# Altium footprint library MainLibrary.PcbLib: 85 footprints (part 3 of 6)
Each footprint in its own frame and in the unit in brackets; x right, y up, seen from the top. Pads: shape width x height; smd on the part's side, far side on the other; paste and mask are expansions set on the pad; w line width, h text height; cw(c..) or ccw(c..) is an arc to the next point about the centre after c.
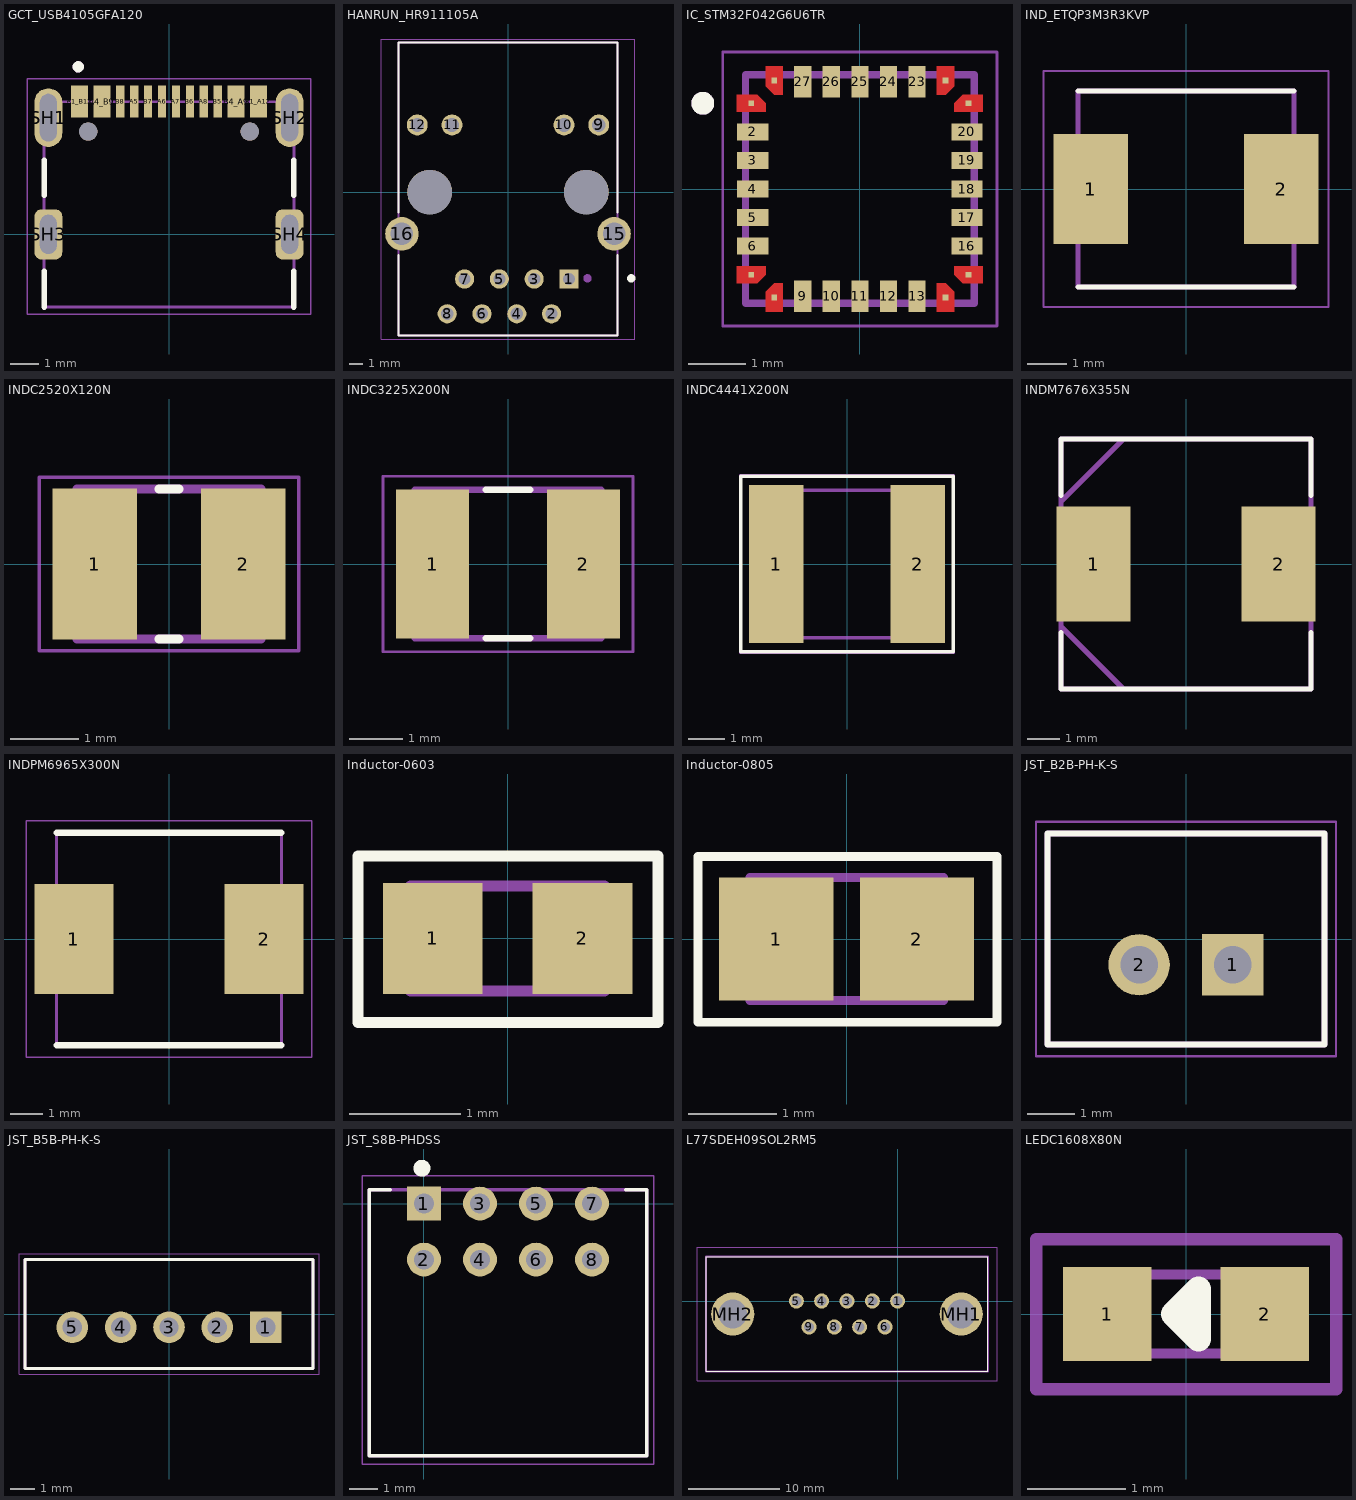
[diagram p2: the footprints below, top view; thin cyan lines are the x and y axes]

## GCT_USB4105GFA120 [mm]
height 3.31
pads (18):
  rect 0.6x1.15 smd: A1_B12(-3.2,4.755) A4_B9(-2.4,4.755) B1_A12(3.2,4.755) B4_A9(2.4,4.755)
  rect 0.3x1.15 smd: A5(-1.25,4.755) A6(-0.25,4.755) A7(0.25,4.755) A8(1.25,4.755) B5(1.75,4.755) B6(0.75,4.755) B7(-0.75,4.755) B8(-1.75,4.755)
  oval 1x2.1 hole 0.6 slot 1.7 at 90 deg: SH1(-4.32,4.18) SH2(4.32,4.18)
  rrect50% 1x1.8 hole 0.6 slot 1.4 at 90 deg: SH3(-4.32,0) SH4(4.32,0)
  round 0.65 hole 0.65 unplated: ""(-2.89,3.68) ""(2.89,3.68)
Top Overlay:
  circle w0.2: c-3.25,6 r0.1
  lines w0.2: -4.47,-2.6 -4.47,-1.32 ; -4.47,1.4 -4.47,2.65 ; 4.47,-2.6 4.47,-1.32 ; 4.47,1.4 4.47,2.65
Mechanical 13:
  circle w0.2: c-3.25,6 r0.1
  lines w0.1: -4.47,-2.6 4.47,-2.6 4.47,4.75 -4.47,4.75 -4.47,-2.6
Mechanical 15:
  lines w0.05: -5.07,-2.85 -5.07,5.58 5.07,5.58 5.07,-2.85 -5.07,-2.85
3D body "step_temp.STEP": height 3.31, standoff -1.2, extent -4.47,-2.6 4.47,5.11

## HANRUN_HR911105A [mm]
pads (16):
  rect 1.398x1.398 / inner round 1.398 / far side rect 1.398x1.398 hole 0.89: 1(4.45,-6.35)
  round 1.398 hole 0.89: 2(3.18,-8.89) 3(1.91,-6.35) 4(0.64,-8.89) 5(-0.63,-6.35) 6(-1.9,-8.89) 7(-3.17,-6.35) 8(-4.44,-8.89)
  round 1.53 hole 1.02: 9(6.625,4.9) 10(4.085,4.9) 11(-4.085,4.9) 12(-6.625,4.9)
  round 2.445 hole 1.63: 15(7.745,-3.05) 16(-7.745,-3.05)
  round 3.25 hole 3.25 unplated: ""(-5.715,0) ""(5.715,0)
Top Overlay:
  circle w0.3: c9,-6.3 r0.15
  lines w0.127: -8,-4.6 -8,-10.48 8,-10.48 8,-4.6 ; -8,-1.5 -8,10.92 8,10.92 8,-1.5
Mechanical 13:
  circle w0.3: c5.8,-6.3 r0.15
  lines w0.127: -8,-10.48 -8,10.92 8,10.92 8,-10.48 -8,-10.48
Mechanical 15:
  lines w0.05: -9.25,-10.73 -9.25,11.17 9.25,11.17 9.25,-10.73 -9.25,-10.73
3D body "step_temp.STEP": height 13.5, standoff -3.05, extent -8.02,-10.38 8.02,10.92

## IC_STM32F042G6U6TR [mm]
pads (28):
  rect 0.1x0.1 smd paste-1 mask+0: 1(-1.9,1.5) 7(-1.9,-1.5) 8(-1.5,-1.9) 14(1.5,-1.9) 15(1.9,-1.5) 21(1.9,1.5) 22(1.5,1.9) 28(-1.5,1.9)
  rect 0.55x0.3 smd: 2(-1.875,1) 3(-1.875,0.5) 4(-1.875,0) 5(-1.875,-0.5) 6(-1.875,-1) 16(1.875,-1) 17(1.875,-0.5) 18(1.875,0) 19(1.875,0.5) 20(1.875,1)
  rect 0.3x0.55 smd: 9(-1,-1.875) 10(-0.5,-1.875) 11(0,-1.875) 12(0.5,-1.875) 13(1,-1.875) 23(1,1.875) 24(0.5,1.875) 25(0,1.875) 26(-0.5,1.875) 27(-1,1.875)
Top Layer:
  region: -1.65,1.5 -1.65,1.35 -2.15,1.35 -2.15,1.65 -1.8,1.65
  region: -1.65,-1.5 -1.8,-1.65 -2.15,-1.65 -2.15,-1.35 -1.65,-1.35
  region: -1.35,-2.15 -1.65,-2.15 -1.65,-1.8 -1.5,-1.65 -1.35,-1.65
  region: 1.65,-1.8 1.65,-2.15 1.35,-2.15 1.35,-1.65 1.5,-1.65
  region: 2.15,-1.65 1.8,-1.65 1.65,-1.5 1.65,-1.35 2.15,-1.35
  region: 2.15,1.35 1.65,1.35 1.65,1.5 1.8,1.65 2.15,1.65
  region: 1.65,1.8 1.5,1.65 1.35,1.65 1.35,2.15 1.65,2.15
  region: -1.35,1.65 -1.5,1.65 -1.65,1.8 -1.65,2.15 -1.35,2.15
Top Overlay:
  circle w0.2: c-2.75,1.5 r0.1
Top Paste:
  region: -1.65,1.5 -1.65,1.35 -2.15,1.35 -2.15,1.65 -1.8,1.65
  region: -1.65,-1.5 -1.8,-1.65 -2.15,-1.65 -2.15,-1.35 -1.65,-1.35
  region: -1.35,-2.15 -1.65,-2.15 -1.65,-1.8 -1.5,-1.65 -1.35,-1.65
  region: 1.65,-1.8 1.65,-2.15 1.35,-2.15 1.35,-1.65 1.5,-1.65
  region: 2.15,-1.65 1.8,-1.65 1.65,-1.5 1.65,-1.35 2.15,-1.35
  region: 2.15,1.35 1.65,1.35 1.65,1.5 1.8,1.65 2.15,1.65
  region: 1.65,1.8 1.5,1.65 1.35,1.65 1.35,2.15 1.65,2.15
  region: -1.35,1.65 -1.5,1.65 -1.65,1.8 -1.65,2.15 -1.35,2.15
Top Solder:
  region: -1.55,1.5 -1.55,1.25 -2.25,1.25 -2.25,1.75 -1.8,1.75
  region: -1.55,-1.5 -1.8,-1.75 -2.25,-1.75 -2.25,-1.25 -1.55,-1.25
  region: -1.25,-2.25 -1.75,-2.25 -1.75,-1.8 -1.5,-1.55 -1.25,-1.55
  region: 1.75,-1.8 1.75,-2.25 1.25,-2.25 1.25,-1.55 1.5,-1.55
  region: 2.25,-1.75 1.8,-1.75 1.55,-1.5 1.55,-1.25 2.25,-1.25
  region: 2.25,1.25 1.55,1.25 1.55,1.5 1.8,1.75 2.25,1.75
  region: 1.75,1.8 1.5,1.55 1.25,1.55 1.25,2.25 1.75,2.25
  region: -1.25,1.55 -1.5,1.55 -1.75,1.8 -1.75,2.25 -1.25,2.25
Mechanical 13:
  circle w0.2: c-2.75,1.5 r0.1
  lines w0.127: -2,-2 2,-2 2,2 -2,2 -2,-2
Mechanical 15:
  lines w0.05: -2.4,-2.4 2.4,-2.4 2.4,2.4 -2.4,2.4 -2.4,-2.4
3D body "STM32F042G6U6TR.STEP": height 0.6, standoff 0, extent -2,-2 2,2

## IND_ETQP3M3R3KVP [mm]
pads (2):
  rect 1.905x2.79 smd: 1(-2.425,0) 2(2.425,0)
Top Overlay:
  lines w0.127: -2.75,-2.5 2.75,-2.5 ; -2.75,2.5 2.75,2.5
Mechanical 13:
  lines w0.127: -2.75,-2.5 2.75,-2.5 2.75,2.5 -2.75,2.5 -2.75,-2.5
Mechanical 15:
  lines w0.05: -3.628,-3 3.628,-3 3.628,3 -3.628,3 -3.628,-3
3D body "step_temp.STEP": height 3.05, standoff 0.05, extent -2.75,-2.5 2.75,2.5

## INDC2520X120N [mm]
pads (2):
  rect 1.24x2.22 smd: 1(-1.09,0) 2(1.09,0)
Top Overlay:
  lines w0.127: -0.15,-1.1 0.15,-1.1 ; -0.15,1.1 0.15,1.1
Mechanical 13:
  lines w0.127: -1.35,-1.1 1.35,-1.1 1.35,1.1 -1.35,1.1 -1.35,-1.1
Mechanical 15:
  lines w0.05: -1.905,-1.27 1.905,-1.27 1.905,1.27 -1.905,1.27 -1.905,-1.27
3D body "DFE252012P-1R5M=P2.STEP": height 1.2, standoff 0, extent -1.25,-1 1.25,1

## INDC3225X200N [mm]
pads (2):
  rect 1.37x2.81 smd: 1(-1.421,0) 2(1.421,0)
Top Overlay:
  lines w0.127: -0.42,-1.4 0.42,-1.4 ; -0.42,1.4 0.42,1.4
Mechanical 13:
  lines w0.127: -1.75,-1.4 -1.75,1.4 1.75,1.4 1.75,-1.4 -1.75,-1.4
Mechanical 15:
  lines w0.05: -2.355,-1.655 -2.355,1.655 2.355,1.655 2.355,-1.655 -2.355,-1.655
3D body "step_temp.STEP": height 2, standoff 0, extent -1.6,-1.25 1.6,1.25

## INDC4441X200N [mm]
pads (2):
  rect 1.5x4.35 smd: 1(-1.95,0) 2(1.95,0)
Top Overlay:
  lines w0.1: -2.921,-2.413 2.921,-2.413 2.921,2.413 -2.921,2.413 -2.921,-2.413
Mechanical 13:
  lines w0.1: -2.225,-2.03 -2.225,2.03 2.225,2.03 2.225,-2.03 -2.225,-2.03
Mechanical 15:
  lines w0.05: -2.95,-2.45 -2.95,2.45 2.95,2.45 2.95,-2.45 -2.95,-2.45
3D body "SRP4020TA-2R2M.stp": height 2, standoff 0, extent -2.225,-2.03 2.225,2.03

## INDM7676X355N [mil]
pads (2):
  rect 89x138 smd: 1(-111,0) 2(111,0)
Top Overlay:
  lines w6: -150,-82 -150,-150 150,-150 150,-82 ; -150,82 -150,150 150,150 150,82
Mechanical 13:
  lines w6: -150,-75 -75,-150 ; -150,75 -75,150 ; -150,-150 -150,150 150,150 150,-150 -150,-150
3D body "step_temp.STEP": height 139.76, standoff 0, extent -149.61,-149.61 149.61,149.61

## INDPM6965X300N [mm]
pads (2):
  rect 2.4x3.35 smd: 1(-2.9,0) 2(2.9,0)
Top Overlay:
  lines w0.2: -3.43,-3.235 3.43,-3.235 ; -3.43,3.235 3.43,3.235
Mechanical 13:
  lines w0.1: -3.43,-3.235 -3.43,3.235 3.43,3.235 3.43,-3.235 -3.43,-3.235
Mechanical 15:
  lines w0.05: -4.35,-3.612 -4.35,3.612 4.35,3.612 4.35,-3.612 -4.35,-3.612
3D body "IHLP2525CZER220M8A.stp": height 2.89, standoff 0, extent -3.542,-3.331 3.535,3.339

## Inductor-0603 [mm]
pads (2):
  rect 0.9x1 smd: 1(-0.675,0) 2(0.675,0)
Top Overlay:
  lines w0.1: -1.35,-0.76 1.357,-0.76 1.357,0.744 -1.35,0.744 -1.35,-0.76
Mechanical 13:
  lines w0.1: -0.875,-0.475 0.875,-0.475 0.875,0.475 -0.875,0.475 -0.875,-0.475
Mechanical 15:
  lines w0.05: -1.35,-0.75 1.35,-0.75 1.35,0.75 -1.35,0.75 -1.35,-0.75
3D body "FER 0603.STEP": height 0.82, standoff 0, extent -0.8,-0.412 0.8,0.412

## Inductor-0805 [mm]
pads (2):
  rect 1.3x1.4 smd: 1(-0.8,0) 2(0.8,0)
Top Overlay:
  lines w0.1: -1.689,-0.946 1.709,-0.946 1.709,0.938 -1.689,0.938 -1.689,-0.946
Mechanical 13:
  lines w0.1: -1.1,-0.7 1.1,-0.7 1.1,0.7 -1.1,0.7 -1.1,-0.7
Mechanical 15:
  lines w0.05: -1.7,-0.95 1.7,-0.95 1.7,0.95 -1.7,0.95 -1.7,-0.95
3D body "FER 0805.STEP": height 1.26, standoff -0.02, extent -1,-0.637 1,0.637

## JST_B2B-PH-K-S [mm]
pads (2):
  rect 1.308x1.308 / inner round 1.308 / far side rect 1.308x1.308 hole 0.8: 1(1,-0.55)
  round 1.308 hole 0.8: 2(-1,-0.55)
Top Overlay:
  lines w0.127: -2.95,-2.25 2.95,-2.25 2.95,2.25 -2.95,2.25 -2.95,-2.25
Mechanical 13:
  lines w0.127: -2.95,-2.25 -2.95,2.25 2.95,2.25 2.95,-2.25 -2.95,-2.25
Mechanical 15:
  lines w0.05: -3.2,-2.5 -3.2,2.5 3.2,2.5 3.2,-2.5 -3.2,-2.5
3D body "step_temp.STEP": height 6, standoff -3.4, extent -2.95,-2.25 2.95,2.25

## JST_B5B-PH-K-S [mm]
pads (5):
  rect 1.308x1.308 / inner round 1.308 / far side rect 1.308x1.308 hole 0.8: 1(4,-0.55)
  round 1.308 hole 0.8: 2(2,-0.55) 3(0,-0.55) 4(-2,-0.55) 5(-4,-0.55)
Top Overlay:
  lines w0.127: -5.95,-2.25 5.95,-2.25 5.95,2.25 -5.95,2.25 -5.95,-2.25
Mechanical 13:
  lines w0.127: -5.95,-2.25 -5.95,2.25 5.95,2.25 5.95,-2.25 -5.95,-2.25
Mechanical 15:
  lines w0.05: -6.2,-2.5 -6.2,2.5 6.2,2.5 6.2,-2.5 -6.2,-2.5
3D body "B5B-PH-K-S--3DModel-STEP-510211.STEP": height 6, standoff -3.4, extent -5.975,-2.199 5.925,2.301

## JST_S8B-PHDSS [mm]
pads (8):
  rect 1.208x1.208 hole 0.7: 1(0,0)
  round 1.208 hole 0.7: 2(0,-2) 3(2,0) 4(2,-2) 5(4,0) 6(4,-2) 7(6,0) 8(6,-2)
Top Overlay:
  circle w0.3: c-0.074,1.262 r0.15
  lines w0.127: -1.2,0.5 -1.95,0.5 -1.95,-9 7.95,-9 7.95,0.5 7.2,0.5
Mechanical 13:
  lines w0.127: -1.95,-9 -1.95,0.5 7.95,0.5 7.95,-9 -1.95,-9
Mechanical 15:
  lines w0.05: -2.2,-9.3 8.2,-9.3 8.2,1 -2.2,1 -2.2,-9.3
3D body "S8B-PHDSS--3DModel-STEP-56544.STEP": height 5, standoff -3, extent -1.899,-8.941 8.001,0.559

## L77SDEH09SOL2RM5 [mm]
pads (11):
  round 1.65 hole 1.1: 1(0,0) 2(-2.77,0) 3(-5.54,0) 4(-8.31,0) 5(-11.08,0) 6(-1.385,-2.84) 7(-4.155,-2.84) 8(-6.925,-2.84) 9(-9.695,-2.84)
  round 4.725 hole 3.15: MH1(6.955,-1.42) MH2(-18.035,-1.42)
Top Overlay:
  lines w0.1: -20.945,-7.695 -20.945,4.855 9.865,4.855 9.865,-7.695 -20.945,-7.695
Mechanical 15:
  lines w0.2: -20.945,-7.695 -20.945,4.855 9.865,4.855 9.865,-7.695 -20.945,-7.695
Mechanical 20:
  lines w0.1: -21.945,-8.695 -21.945,5.855 10.865,5.855 10.865,-8.695 -21.945,-8.695
3D body "L77SDEH09SOL2RM5--3DModel-STEP-533217.STEP": height 12.28, standoff -4.52, extent -20.993,-7.799 9.817,4.751

## LEDC1608X80N [mm]
pads (2):
  rect 0.9x0.95 smd: 1(-0.8,0) 2(0.8,0)
Top Overlay:
  lines w0.254: 0.127,0 -0.127,0 ; -0.127,0 0.127,-0.254 0.127,0.254 -0.127,0
Mechanical 13:
  lines w0.1: -0.8,0.133 -0.533,0.4 ; -0.8,-0.4 0.8,-0.4 0.8,0.4 -0.8,0.4 -0.8,-0.4
Mechanical 15:
  lines w0.127: -1.524,-0.762 1.524,-0.762 1.524,0.762 -1.524,0.762 -1.524,-0.762
3D body "597-3326-607F.STEP": height 0.7, standoff 0, extent -0.8,-0.4 0.8,0.4